# Altium footprint library ACTION_IC.PcbLib: 137 footprints (part 4 of 9)
Each footprint in its own frame and in the unit in brackets; x right, y up, seen from the top. Pads: shape width x height; smd on the part's side, far side on the other; paste and mask are expansions set on the pad; w line width, h text height; cw(c..) or ccw(c..) is an arc to the next point about the centre after c.
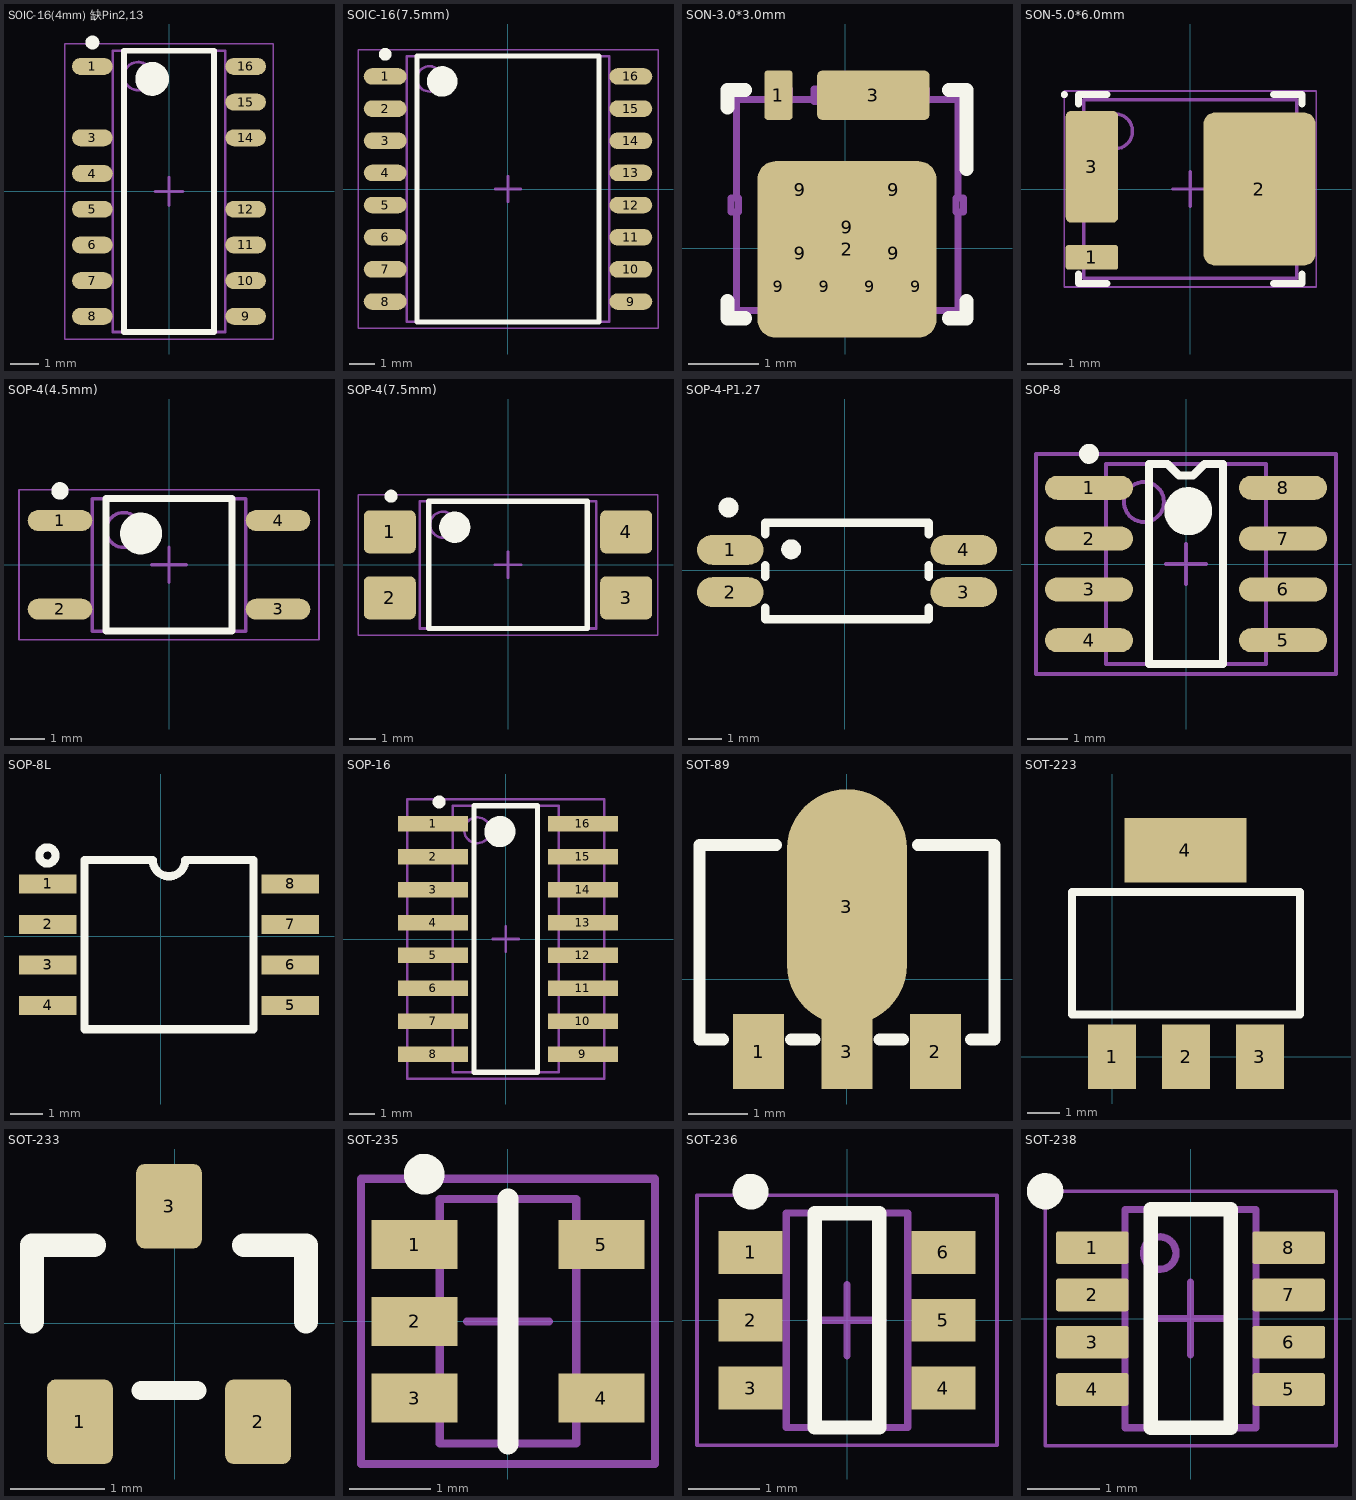
[diagram p3: the footprints below, top view; thin cyan lines are the x and y axes]

## SOIC-16(4mm) 缺Pin2,13 [mm]
height 1.75
pads (14):
  oval 1.45x0.6 smd: 1(-2.725,4.445) 3(-2.725,1.905) 4(-2.725,0.635) 5(-2.725,-0.635) 6(-2.725,-1.905) 7(-2.725,-3.175) 8(-2.725,-4.445) 9(2.725,-4.445) 10(2.725,-3.175) 11(2.725,-1.905) 12(2.725,-0.635) 14(2.725,1.905) 15(2.725,3.175) 16(2.725,4.445)
Top Overlay:
  circle w0.25: c-2.725,5.295 r0.125
  circle w0.6: c-0.6,4 r0.3
  lines w0.2: -1.6,-5 -1.6,5 1.6,5 1.6,-5 -1.6,-5
Mechanical 13:
  circle w0.1: c-1.1,4.1 r0.5
  lines w0.1: -2,-5 -2,5 2,5 2,-5 -2,-5
Mechanical 15:
  lines w0.05: -3.7,-5.25 -3.7,5.25 3.7,5.25 3.7,-5.25 -3.7,-5.25
  lines w0.1: -0.5,0 0.5,0 ; 0,-0.5 0,0.5
3D body "SOIC127P600-8N.step": height 1.75, standoff 0, extent -3,-5 3,5

## SOIC-16(7.5mm) [mm]
pads (16):
  oval 1.7x0.65 smd: 1(-4.85,4.445) 2(-4.85,3.175) 3(-4.85,1.905) 4(-4.85,0.635) 5(-4.85,-0.635) 6(-4.85,-1.905) 7(-4.85,-3.175) 8(-4.85,-4.445) 9(4.85,-4.445) 10(4.85,-3.175) 11(4.85,-1.905) 12(4.85,-0.635) 13(4.85,0.635) 14(4.85,1.905) 15(4.85,3.175) 16(4.85,4.445)
Top Overlay:
  circle w0.6: c-2.6,4.25 r0.3
  circle w0.25: c-4.85,5.32 r0.125
  lines w0.2: -3.6,-5.25 3.6,-5.25 3.6,5.25 -3.6,5.25 -3.6,-5.25
Mechanical 13:
  circle w0.1: c-3.1,4.35 r0.5
  lines w0.1: -4,-5.25 4,-5.25 4,5.25 -4,5.25 -4,-5.25
Mechanical 15:
  lines w0.05: -5.925,-5.5 5.925,-5.5 5.925,5.5 -5.925,5.5 -5.925,-5.5
  lines w0.1: -0.5,0 0.5,0 ; 0,-0.5 0,0.5
3D body "SOIC127P1050X358-16N.step": height 3.58, standoff 0, extent -5.26,-5.25 5.26,5.25

## SON-3.0*3.0mm [mm]
pads (12):
  rrect20% 0.4x0.7 smd paste-0.05: 1(-0.95,2.178)
  rrect20% 2.55x2.51 smd paste-1.5: 2(0.025,-0.017)
  rrect20% 1.6x0.7 smd paste-0.05: 3(0.401,2.178)
  rect 0.3x0.5 on Top Solder: 9(-0.95,-0.547) 9(-0.3,-0.547) 9(0.35,-0.547) 9(1,-0.547)
  rrect14% 1.125x0.705 on Top Paste: 9(-0.637,-0.069) 9(-0.637,0.836) 9(0.688,-0.069) 9(0.688,0.836)
  rrect6% 2.45x1.775 on Top Solder: 9(0.025,0.301)
Top Overlay:
  lines w0.2: -1.675,-0.75 -1.675,-0.997 -1.428,-0.997 ; -1.675,2.006 -1.675,2.253 -1.428,2.253 ; 1.478,-0.997 1.725,-0.997 1.725,-0.75 ; 1.478,2.253 1.725,2.253 1.725,1.128
Mechanical 5:
  lines w0.1: -1.544,0.516 -1.544,-0.884 -1.094,-0.884 ; -1.544,0.716 -1.544,2.116 -1.094,2.116 ; -0.794,-0.884 -0.444,-0.884 ; -0.794,2.116 -0.444,2.116 ; -0.144,-0.884 0.206,-0.884 ; -0.144,2.116 0.206,2.116 ; 0.506,-0.884 0.856,-0.884 ; 0.506,2.116 0.856,2.116 ; 1.156,-0.884 1.606,-0.884 1.606,0.516 ; 1.156,2.116 1.606,2.116 1.606,0.716 ; -1.624,0.516 -1.518,0.516 -1.518,0.716 -1.624,0.716 -1.624,0.516 ; -1.094,-1.034 -0.794,-1.034 -0.794,-0.858 -1.094,-0.858 -1.094,-1.034 ; -1.094,2.089 -1.094,2.266 -0.794,2.266 -0.794,2.089 -1.094,2.089 ; -0.444,-1.034 -0.444,-0.858 -0.144,-0.858 -0.144,-1.034 -0.444,-1.034 ; -0.444,2.089 -0.444,2.266 -0.144,2.266 -0.144,2.089 -0.444,2.089 ; 0.206,-1.034 0.506,-1.034 0.506,-0.858 0.206,-0.858 0.206,-1.034 ; 0.206,2.089 0.206,2.266 0.506,2.266 0.506,2.089 0.206,2.089 ; 0.856,-1.034 1.156,-1.034 1.156,-0.858 0.856,-0.858 0.856,-1.034 ; 0.856,2.089 0.856,2.266 1.156,2.266 1.156,2.089 0.856,2.089 ; 1.58,0.516 1.686,0.516 1.686,0.716 1.58,0.716 1.58,0.516
3D body "DNH0008A.stp": height 0.91, standoff 0.01, extent -1.629,-1.022 1.681,2.278

## SON-5.0*6.0mm [mm]
height 0.8
pads (3):
  rrect20% 1.5x0.7 smd: 1(-2.81,-1.956)
  rrect20% 3.2x4.38 smd: 2(1.981,0)
  rrect20% 1.5x3.2 smd: 3(-2.81,0.635)
Top Overlay:
  circle w0.1: c-3.6,2.7 r0.05
  lines w0.2: -3.2,-2.43 -3.2,-2.7 -2.385,-2.7 ; -3.2,2.43 -3.2,2.7 -2.385,2.7 ; 2.385,-2.7 3.2,-2.7 3.2,-2.43 ; 2.385,2.7 3.2,2.7 3.2,2.43
Mechanical 13:
  circle w0.1: c-2.15,1.65 r0.5
  lines w0.1: -3.05,-2.55 3.05,-2.55 3.05,2.55 -3.05,2.55 -3.05,-2.55
Mechanical 15:
  lines w0.05: -3.605,-2.8 3.605,-2.8 3.605,2.8 -3.605,2.8 -3.605,-2.8
  lines w0.1: -0.5,0 0.5,0 ; 0,-0.5 0,0.5
3D body: height 0.8, standoff 0.15, extent -3.05,-2.55 3.05,2.55

## SOP-4(4.5mm) [mm]
height 2.7
pads (4):
  oval 1.85x0.6 smd: 1(-3.125,1.27) 2(-3.125,-1.27) 3(3.125,-1.27) 4(3.125,1.27)
Top Overlay:
  circle w0.25: c-3.125,2.12 r0.125
  circle w0.6: c-0.8,0.9 r0.3
  lines w0.2: -1.8,-1.9 -1.8,1.9 1.8,1.9 1.8,-1.9 -1.8,-1.9
Mechanical 13:
  circle w0.1: c-1.3,1 r0.5
  lines w0.1: -2.2,-1.9 -2.2,1.9 2.2,1.9 2.2,-1.9 -2.2,-1.9
Mechanical 15:
  lines w0.05: -4.3,-2.15 -4.3,2.15 4.3,2.15 4.3,-2.15 -4.3,-2.15
  lines w0.1: -0.5,0 0.5,0 ; 0,-0.5 0,0.5
3D body "sop-4(4.5mm).step": height 2.7, standoff 0, extent -3.5,-1.9 3.5,1.9

## SOP-4(7.5mm) [mm]
height 3.9
pads (4):
  rrect25% 2x1.65 smd: 1(-4.551,1.27) 2(-4.551,-1.27) 3(4.551,-1.27) 4(4.551,1.27)
Top Overlay:
  circle w0.6: c-2.05,1.45 r0.3
  circle w0.25: c-4.5,2.645 r0.125
  lines w0.2: -3.05,-2.45 3.05,-2.45 3.05,2.45 -3.05,2.45 -3.05,-2.45
Mechanical 13:
  circle w0.1: c-2.5,1.55 r0.5
  lines w0.1: -3.4,-2.45 3.4,-2.45 3.4,2.45 -3.4,2.45 -3.4,-2.45
Mechanical 15:
  lines w0.05: -5.775,-2.7 5.775,-2.7 5.775,2.7 -5.775,2.7 -5.775,-2.7
  lines w0.1: -0.5,0 0.5,0 ; 0,-0.5 0,0.5
3D body "SOP-4(7.5mm).step": height 3.9, standoff 0, extent -5.075,-2.45 5.075,2.45

## SOP-4-P1.27 [mm]
pads (4):
  oval 2x0.9 smd: 1(-3.428,0.612) 2(-3.428,-0.658) 3(3.572,-0.658) 4(3.572,0.612)
Top Overlay:
  lines w0.254: -2.378,-1.119 -2.378,-1.473 2.522,-1.473 2.522,-1.12 ; -2.378,-0.197 -2.378,0.151 ; -2.378,1.073 -2.378,1.427 2.522,1.427 2.522,1.074 ; 2.522,-0.196 2.522,0.15
  lines w0.3: -3.485,2.032 ccw(c-3.484,1.882) -3.483,2.032 ; -1.602,0.778 ccw(c-1.601,0.628) -1.6,0.778

## SOP-8 [mm] "SOP, 8-Leads, Body 5.0x4.0mm (max), Pitch 1.27mm, IPC Medium Density"
height 1.75
pads (8):
  oval 2.2x0.6 smd: 1(-2.425,1.905) 2(-2.425,0.635) 3(-2.425,-0.635) 4(-2.425,-1.905) 5(2.425,-1.905) 6(2.425,-0.635) 7(2.425,0.635) 8(2.425,1.905)
Top Overlay:
  circle w0.6: c0.056,1.321 r0.3
  circle w0.25: c-2.425,2.755 r0.125
  lines w0.2: -0.925,-2.5 0.925,-2.5 0.925,2.5 0.463,2.5 0.172,2.21 -0.172,2.21 -0.462,2.5 -0.925,2.5 -0.925,-2.5
Mechanical 13:
  circle w0.1: c-1.05,1.55 r0.5
  lines w0.1: -2,-2.5 2,-2.5 2,2.5 -2,2.5 -2,-2.5
Mechanical 15:
  lines w0.1: -0.5,0 0.5,0 ; 0,-0.5 0,0.5 ; -3.75,-2.75 3.75,-2.75 3.75,2.75 -3.75,2.75 -3.75,-2.75
3D body "User Library-sop-8.STEP": height 1.6, standoff 0, extent -2.894,-2.485 3.148,2.535

## SOP-8L [mm]
pads (8):
  rect 1.8x0.599 smd: 1(-3.539,1.645) 2(-3.539,0.375) 3(-3.539,-0.895) 4(-3.539,-2.165) 5(4.061,-2.165) 6(4.061,-0.895) 7(4.061,0.375) 8(4.061,1.645)
Top Overlay:
  circle w0.254: c-3.549,2.534 r0.254
  lines w0.254: -0.247,2.389 ccw(c0.261,2.39) 0.769,2.39 2.911,2.39 2.911,-2.91 -2.389,-2.91 -2.389,2.39 -0.247,2.39

## SOP-16 [mm] "SOP, 16-Leads, Body 10.3x4.1mm (max), Pitch 1.27mm, IPC Medium Density"
height 1.8
pads (16):
  rect 2.7x0.6 smd: 1(-2.804,4.445) 2(-2.804,3.175) 3(-2.804,1.905) 4(-2.804,0.635) 5(-2.804,-0.635) 6(-2.804,-1.905) 7(-2.804,-3.175) 8(-2.804,-4.445) 9(2.981,-4.445) 10(2.981,-3.175) 11(2.981,-1.905) 12(2.981,-0.635) 13(2.981,0.635) 14(2.981,1.905) 15(2.981,3.175) 16(2.981,4.445)
Top Overlay:
  circle w0.6: c-0.225,4.15 r0.3
  circle w0.25: c-2.575,5.295 r0.125
  lines w0.2: -1.225,-5.15 1.225,-5.15 1.225,5.15 -1.225,5.15 -1.225,-5.15
Mechanical 13:
  circle w0.1: c-1.1,4.2 r0.5
  lines w0.1: -2.05,-5.15 2.05,-5.15 2.05,5.15 -2.05,5.15 -2.05,-5.15
Mechanical 15:
  lines w0.1: -0.5,0 0.5,0 ; 0,-0.5 0,0.5 ; -3.8,-5.4 3.8,-5.4 3.8,5.4 -3.8,5.4 -3.8,-5.4
3D body "User Library-User Library-TLP291-4(SOP16).STEP": height 2.1, standoff 0, extent -3.195,-5.201 3.805,5.099

## SOT-89 [mil]
pads (4):
  rect 34x50 smd: 1(-59.05,-48.27) 2(59.05,-48.27) 3(0,-48.27)
  oval 80x157.48 smd: 3(0,48.27)
Top Overlay:
  lines w7.87: -82.68,-40.31 -98.42,-40.31 -98.42,89.61 -47.24,89.61 ; 47.24,89.61 98.43,89.61 98.43,-40.31
  lines w8: -37.4,-40.31 -21.65,-40.31 ; 21.65,-40.31 37.4,-40.31 ; 82.68,-40.31 98.43,-40.31
3D body "SOT-89.STEP": height 59.45, standoff 0, extent -87.4,-59.45 89.76,109.84

## SOT-223 [mil]
pads (4):
  rect 59x79 smd: 1(0,0) 2(90.55,0) 3(181.1,0)
  rect 150x79 smd: 4(89.88,253.54)
Top Overlay:
  lines w10: -49.45,52 230.55,52 230.55,202 -49.45,202 -49.45,52
3D body "SOT223.STEP": height 65.04, standoff 0.08, extent -41.95,-11.79 213.96,263.8

## SOT-233 [mm]
pads (3):
  rrect25% 0.7x0.9 smd: 1(-1.011,-1.05) 2(0.889,-1.05) 3(-0.061,1.25)
Top Overlay:
  lines w0.2: -0.361,-0.717 0.239,-0.717
  lines w0.254: -1.521,0.018 -1.521,0.833 -0.861,0.833 ; 1.399,0.018 1.399,0.833 ; 0.739,0.833 1.399,0.833 ; 0.739,0.833 1.399,0.833 ; 0.739,0.833 1.399,0.833
3D body "SOT-23A.STEP": height 1.2, standoff 0, extent -1.513,-1.29 1.387,1.51

## SOT-235 [mm] "SOT23, 5-Leads, Body 3.0x2.6mm (max), Pitch 0.95mm, IPC Medium Density"
height 1.22
pads (5):
  rect 1.05x0.6 smd: 1(-1.143,0.94) 2(-1.143,0) 3(-1.143,-0.94) 4(1.143,-0.94) 5(1.143,0.94)
Top Overlay:
  circle w0.25: c-1.025,1.8 r0.125
  lines w0.254: 0,-1.5 0,1.5
Mechanical 13:
  lines w0.1: -0.835,-1.495 -0.835,1.495 0.835,1.495 0.835,-1.495 -0.835,-1.495
Mechanical 15:
  lines w0.1: -0.5,0 0.5,0 ; 0,-0.5 0,0.5 ; -1.8,-1.745 -1.8,1.745 1.8,1.745 1.8,-1.745 -1.8,-1.745
3D body "SOT-23-5.STEP": height 1.2, standoff 0, extent -1.4,-1.501 1.4,1.399

## SOT-236 [mm]
height 1
pads (6):
  rect 0.9x0.6 smd: 1(-1.35,0.95) 2(-1.35,0) 3(-1.35,-0.95) 4(1.35,-0.95) 5(1.35,0) 6(1.35,0.95)
Top Overlay:
  circle w0.25: c-1.35,1.8 r0.125
  lines w0.2: -0.45,-1.5 0.45,-1.5 0.45,1.5 -0.45,1.5 -0.45,-1.5
Mechanical 13:
  lines w0.1: -0.85,-1.5 -0.85,1.5 0.85,1.5 0.85,-1.5 -0.85,-1.5
Mechanical 15:
  lines w0.05: -2.1,-1.75 -2.1,1.75 2.1,1.75 2.1,-1.75 -2.1,-1.75
  lines w0.1: -0.5,0 0.5,0 ; 0,-0.5 0,0.5
3D body "SOT-236.step": height 1, standoff 0, extent -1.5,-1.5 1.5,1.5

## SOT-238 [mm]
pads (8):
  rrect15% 1x0.45 smd paste+0 mask+0.051: 1(-1.35,0.975) 2(-1.35,0.325) 3(-1.35,-0.325) 4(-1.35,-0.975) 5(1.35,-0.975) 6(1.35,-0.325) 7(1.35,0.325) 8(1.35,0.975)
Top Overlay:
  circle w0.25: c-2,1.75 r0.125
  lines w0.2: -0.55,-1.5 0.55,-1.5 0.55,1.5 -0.55,1.5 -0.55,-1.5
Mechanical 13:
  circle w0.1: c-0.424,0.9 r0.224
  lines w0.1: -0.9,-1.5 0.9,-1.5 0.9,1.5 -0.9,1.5 -0.9,-1.5
Mechanical 15:
  lines w0.05: -2,-1.75 2,-1.75 2,1.75 -2,1.75 -2,-1.75
  lines w0.1: -0.5,0 0.5,0 ; 0,-0.5 0,0.5
3D body "User Library-sot238.STEP": height 1.2, standoff 0, extent -1.4,-1.47 1.4,1.47